# Altium footprint library 元件1.PcbLib: 420 footprints (part 4 of 27)
Each footprint in its own frame and in the unit in brackets; x right, y up, seen from the top. Pads: shape width x height; smd on the part's side, far side on the other; paste and mask are expansions set on the pad; w line width, h text height; cw(c..) or ccw(c..) is an arc to the next point about the centre after c.
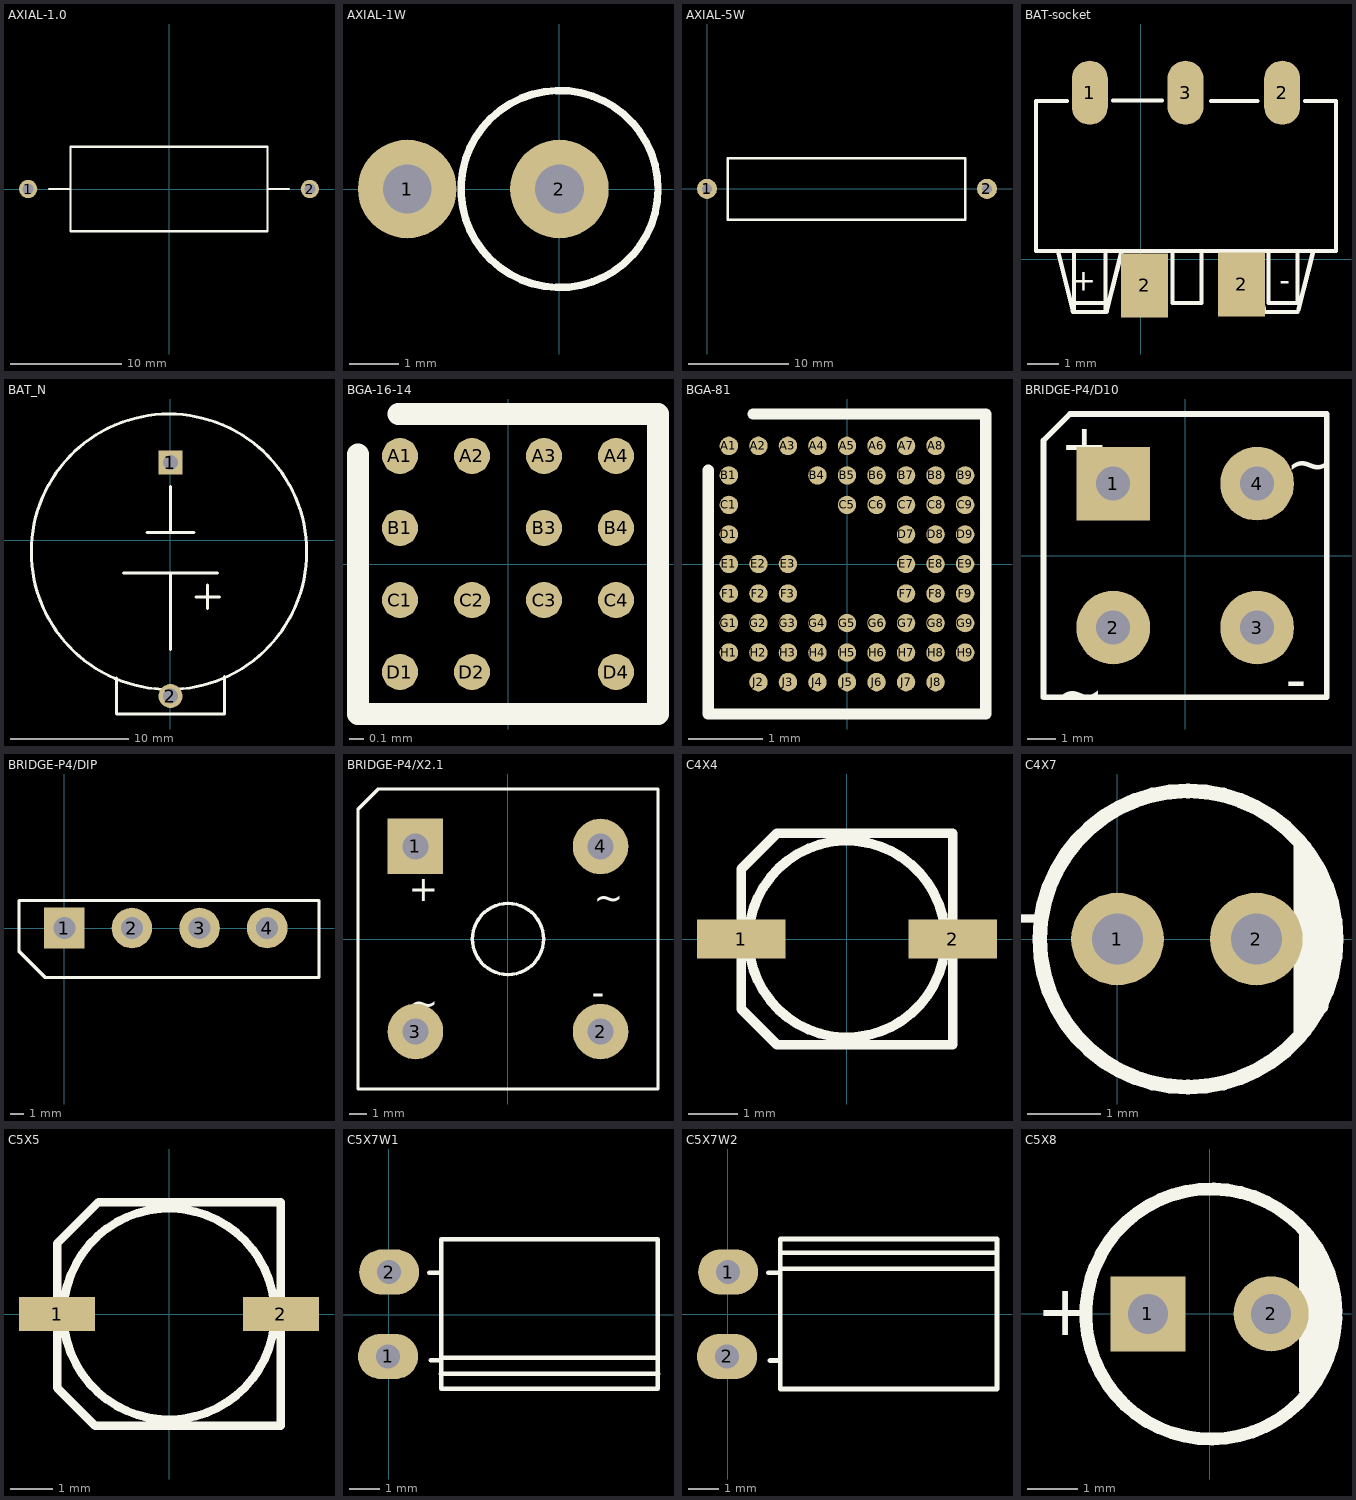
[diagram p3: the footprints below, top view; thin cyan lines are the x and y axes]

## AXIAL-1.0 [mm] "Adjustable Magnetic-Core Inductor; 2 Leads"
height 7.62
pads (2):
  round 1.65 hole 1: 1(-12.7,0) 2(12.7,0)
Top Overlay:
  lines w0.2: -10.795,0 -8.89,0 ; 8.89,0 10.795,0 ; -8.89,-3.81 -8.89,3.81 8.89,3.81 8.89,-3.81 -8.89,-3.81
3D body "AXIAL10.STEP": height 4.3, standoff -1, extent -13.068,-2.362 13.132,2.238

## AXIAL-1W [mil]
pads (2):
  round 79 hole 39: 1(-122.05,0) 2(0,0)
Top Overlay:
  circle w6: c0,0 r79
3D body "1W Carbon Film Resistor.STEP": height 572.61, standoff -75.5, extent -137.24,-83.36 83.23,82

## AXIAL-5W [mm]
pads (2):
  round 2 hole 1: 1(0,0) 2(27.915,0)
Top Overlay:
  lines w0.254: 2.07,-3.073 2.07,3.048 25.743,3.048 25.743,-3.073 2.07,-3.073
3D body "RES-5W-High.STEP": height 8.01, standoff -9, extent -0.4,-3 28.34,3

## BAT-socket [mm]
pads (5):
  oval 1.143x2.032 smd: 1(-1.62,5.283) 2(4.49,5.283) 3(1.42,5.283)
  rect 1.5x2.032 smd: 2(0.12,-0.83) 2(3.2,-0.8)
Top Overlay:
  drawing of 432 lines, arcs and shapes, not listed
  text "-" at 4.75,-1.01 h0.7
  text "+" at -1.41,-1.01 h0.7
3D body "BAT-SOCKET.STEP": height 6.9, standoff 0.15, extent -3.302,-2.072 6.198,5.73

## BAT_N [mil] "CR2032电池座（未加焊）"
pads (2):
  rect 80x80 hole 50: 1(0.21,260.42)
  round 80 hole 50: 2(0.21,-519.58)
Top Overlay:
  circle w10: c-4.79,-37.58 r460
  lines w10: -179.79,-459.58 -179.79,-579.58 180.21,-579.58 180.21,-453.58 ; -156.79,-108.58 157.21,-108.58 ; -77.79,27.34 78.21,27.34 ; 0.21,-364.58 0.21,-108.58 ; 0.21,28.73 0.21,180.42 ; 85.43,-188.34 164.43,-188.34 ; 124.43,-227.34 124.43,-148.34
3D body "bat_n.stp": height 301.57, standoff -181.11, extent -435.69,-565.55 435.69,385.94

## BGA-16-14 [mm]
height 0.65
pads (14):
  round 0.25 smd: A1(-0.75,0.75) A2(-0.25,0.75) A3(0.25,0.75) A4(0.75,0.75) B1(-0.75,0.25) B3(0.25,0.25) B4(0.75,0.25) C1(-0.75,-0.25) C2(-0.25,-0.25) C3(0.25,-0.25) C4(0.75,-0.25) D1(-0.75,-0.75) D2(-0.25,-0.75) D4(0.75,-0.75)
Top Overlay:
  lines w0.152: -1.041,0.762 -1.041,-1.041 1.041,-1.041 1.041,1.041 -0.762,1.041
3D body "BGA-16-14.STEP": height 0.65, standoff 0, extent -0.98,-0.98 0.98,0.98

## BGA-81 [mm]
height 0.55
pads (62):
  round 0.25 smd: A1(-1.6,1.6) A2(-1.2,1.6) A3(-0.8,1.6) A4(-0.4,1.6) A5(0,1.6) A6(0.4,1.6) A7(0.8,1.6) A8(1.2,1.6) B1(-1.6,1.2) B4(-0.4,1.2) B5(0,1.2) B6(0.4,1.2) B7(0.8,1.2) B8(1.2,1.2) B9(1.6,1.2) C1(-1.6,0.8) C5(0,0.8) C6(0.4,0.8) C7(0.8,0.8) C8(1.2,0.8) C9(1.6,0.8) D1(-1.6,0.4) D7(0.8,0.4) D8(1.2,0.4) D9(1.6,0.4) E1(-1.6,0) E2(-1.2,0) E3(-0.8,0) E7(0.8,0) E8(1.2,0) E9(1.6,0) F1(-1.6,-0.4) F2(-1.2,-0.4) F3(-0.8,-0.4) F7(0.8,-0.4) F8(1.2,-0.4) F9(1.6,-0.4) G1(-1.6,-0.8) G2(-1.2,-0.8) G3(-0.8,-0.8) G4(-0.4,-0.8) G5(0,-0.8) G6(0.4,-0.8) G7(0.8,-0.8) G8(1.2,-0.8) G9(1.6,-0.8) H1(-1.6,-1.2) H2(-1.2,-1.2) H3(-0.8,-1.2) H4(-0.4,-1.2) H5(0,-1.2) H6(0.4,-1.2) H7(0.8,-1.2) H8(1.2,-1.2) H9(1.6,-1.2) J2(-1.2,-1.6) J3(-0.8,-1.6) J4(-0.4,-1.6) J5(0,-1.6) J6(0.4,-1.6) J7(0.8,-1.6) J8(1.2,-1.6)
Top Overlay:
  lines w0.152: -1.88,1.27 -1.88,-2.032 1.88,-2.032 1.88,2.032 -1.27,2.032
3D body "BGA-81.STEP": height 0.55, standoff 0, extent -1.775,-1.935 1.775,1.945

## BRIDGE-P4/D10 [mm]
pads (4):
  rect 2.6x2.6 hole 1.2: 1(-2.54,2.54)
  round 2.6 hole 1.2: 2(-2.54,-2.54) 3(2.54,-2.54) 4(2.54,2.54)
Top Overlay:
  lines w0.2: -5,-5 -5,4.064 ; -5,-5 5,-5 ; -5,-5 5,-5 ; -5,-5 -5,4.064 ; -5,4.064 -4.064,5 ; -5,4.064 -4.064,5 ; -4.064,5 5,5 ; -4.064,5 5,5 ; 5,-5 5,5 ; 5,-5 5,5
  text "~" at 3.556,2.54 h1.5
  text "~" at -4.572,-5.588 h1.5
  text "-" at 3.556,-5.08 h1.5
  text "+" at -4.41,3.164 h1.5
3D body: height 3, standoff 1, extent -5.08,-5.08 5.08,5.08
3D body "Pin.STEP": height 3, standoff -2, extent -3.286,1.794 -1.794,3.286
3D body "Pin.STEP": height 3, standoff -2, extent 1.794,-3.286 3.286,-1.794
3D body "Pin.STEP": height 3, standoff -2, extent 1.794,1.794 3.286,3.286
3D body "Pin.STEP": height 3, standoff -2, extent -3.286,-3.286 -1.794,-1.794

## BRIDGE-P4/DIP [mil]
pads (4):
  rect 120x120 hole 65: 1(0,0)
  round 120 hole 65: 2(200,0) 3(400,0) 4(600,0)
Top Overlay:
  circle w10: c0,0 r53.85
  lines w9.84: 753.13,-145.87 753.13,81.42
  lines w10: 752.76,-146.24 -56,-146.24 -134,-68.24 -134,81.42 753.13,81.42
3D body "Pin.STEP": height 118.11, standoff -78.74, extent 570.63,-29.37 629.38,29.38
3D body "Pin.STEP": height 118.11, standoff -78.74, extent 380.63,-39.37 439.38,19.38
3D body "Pin.STEP": height 118.11, standoff -78.74, extent 170.63,-29.37 229.38,29.38
3D body "Pin.STEP": height 118.11, standoff -78.74, extent -19.37,-29.37 39.38,29.38
3D body: height 472.44, standoff 59.06, extent -135,-148 754,81

## BRIDGE-P4/X2.1 [mm]
pads (4):
  rect 3.2x3.2 hole 1.5: 1(-5.335,5.335)
  round 3.2 hole 1.5: 2(5.335,-5.335) 3(-5.335,-5.335) 4(5.335,5.335)
Top Overlay:
  circle w0.2: c0,0 r2.05
  lines w0.2: -8.65,-8.65 8.65,-8.65 8.65,8.65 -7.474,8.65 -8.65,7.474 -8.65,-8.65
  text "~" at -5.723,-4.437 h1.5
  text "~" at 4.945,1.659 h1.5
  text "-" at 4.825,-3.809 h1.5
  text "+" at -5.723,2.167 h1.5
3D body "Pin.STEP": height 3, standoff -2, extent 4.589,-6.081 6.081,-4.589
3D body "Pin.STEP": height 3, standoff -2, extent -6.081,-6.081 -4.589,-4.589
3D body "Pin.STEP": height 3, standoff -2, extent 4.589,4.589 6.081,6.081
3D body "Pin.STEP": height 3, standoff -2, extent -6.081,4.589 -4.589,6.081
3D body: height 4, standoff 1, extent -8.651,-8.651 8.651,8.651

## C4X4 [mm]
height 5.5
pads (2):
  rect 1.8x0.8 smd: 1(-2.15,0) 2(2.15,0)
Top Overlay:
  circle w0.2: c0,0 r2
  lines w0.2: -1.433,-2.139 -2.15,-1.422 ; -1.433,2.139 -2.15,1.422 ; -2.15,-1.422 -2.15,1.422 ; -2.15,-1.422 -1.422,-2.15 2.15,-2.15 2.15,2.15 -1.422,2.15 -2.15,1.422
3D body "SL-B.step": height 5.2, standoff 0, extent -2.286,-2.159 2.314,2.141

## C4X7 [mm]
pads (2):
  round 1.27 hole 0.7: 1(0,0) 2(1.905,0)
Top Overlay:
  circle w0.203: c0.965,0 r2.032
  lines w0.254: 2.54,-1.245 2.54,1.245 ; 2.769,-0.914 2.769,0.864
  text "+" at -1.118,-0.305 h1.02
3D body "Cap 4x7.STEP": height 7.01, standoff -16.99, extent -1.028,-1.981 2.972,2.019

## C5X5 [mm]
height 5.5
pads (2):
  rect 1.8x0.8 smd: 1(-2.65,0) 2(2.65,0)
Top Overlay:
  circle w0.2: c0,0 r2.5
  lines w0.2: -2.65,-1.744 -1.744,-2.65 2.65,-2.65 2.65,2.65 -1.668,2.65 -2.65,1.668 -2.65,-1.744
3D body "SL-D.step": height 5.2, standoff 0, extent -2.8,-2.667 2.8,2.633

## C5X7W1 [mm]
pads (2):
  oval 2x1.5 hole 0.8: 1(-0.024,-1.38) 2(0.012,1.428)
Top Overlay:
  lines w0.152: 1.351,1.409 1.684,1.409 ; 1.4,-1.513 1.723,-1.513 ; 1.729,-1.956 8.96,-1.956 ; 1.784,-1.422 8.905,-1.422 ; 1.75,-2.459 1.75,2.525 8.95,2.525 8.95,-2.459 1.75,-2.459
3D body "User Library-Cap electro 5x7x2mm RA_.STEP": height 5.13, standoff 0.07, extent 1.731,-2.49 9.007,2.561
3D body "3HW1L1.STEP": height 2.7, standoff -1.5, extent -0.216,-1.76 2.465,-0.905
3D body "3HW1L1.STEP": height 2.7, standoff -1.5, extent -0.233,0.75 2.433,1.823

## C5X7W2 [mm]
pads (2):
  oval 2x1.5 hole 0.8: 1(0.018,1.404) 2(-0.018,-1.404)
Top Overlay:
  lines w0.152: 1.356,1.385 1.69,1.385 ; 1.406,-1.537 1.729,-1.537 ; 1.776,1.514 8.955,1.514 ; 1.83,2.048 8.955,2.048 ; 1.756,-2.483 1.756,2.501 8.956,2.501 8.956,-2.483 1.756,-2.483
3D body "3HW1L1.STEP": height 2.7, standoff -1.5, extent -0.345,0.704 2.321,1.777
3D body "3HW1L1.STEP": height 2.7, standoff -1.5, extent -0.376,-1.785 2.305,-0.93
3D body "User Library-Cap electro 5x7x2mm RA_.STEP": height 5.13, standoff 0.07, extent 1.652,-2.519 8.927,2.531

## C5X8 [mm] "RB.1/.2"
pads (2):
  rect 1.5x1.5 hole 0.8: 1(-1.231,0)
  round 1.5 hole 0.8: 2(1.231,0)
Top Overlay:
  lines w0.254: 2.526,-0.076 cw(c0.028,-0.004) 2.527,0.037
  lines w0.3: 1.942,-1.524 1.942,1.549
  lines w0.5: 2.196,-0.94 2.196,0.94
  text "+" at -3.468,-0.432 h1.02
3D body "C5x8.STEP": height 8.13, standoff -2.37, extent -2.499,-2.503 2.501,2.489